# Altium footprint library PcbLib_Pin_Headers_part2.PcbLib: 68 footprints (part 4 of 5)
Each footprint in its own frame and in the unit in brackets; x right, y up, seen from the top. Pads: shape width x height; smd on the part's side, far side on the other; paste and mask are expansions set on the pad; w line width, h text height; cw(c..) or ccw(c..) is an arc to the next point about the centre after c.
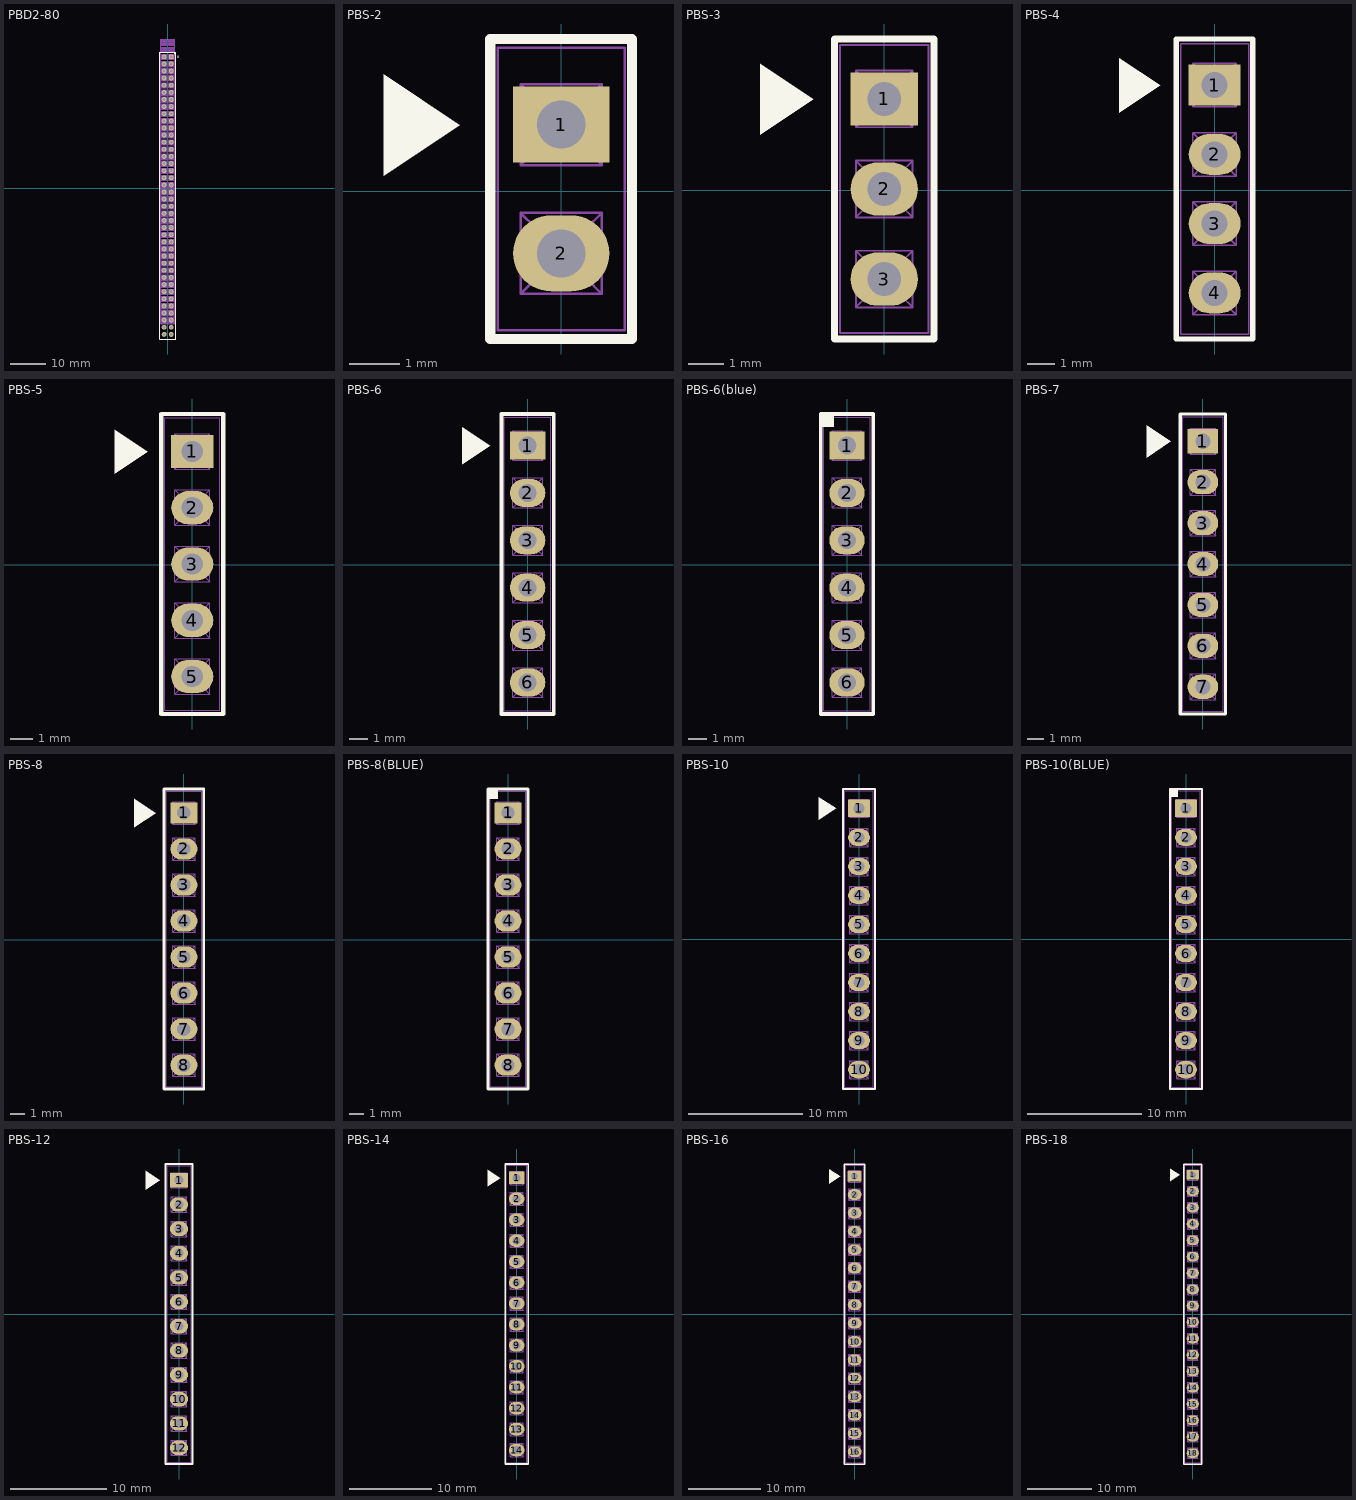
[diagram p3: the footprints below, top view; thin cyan lines are the x and y axes]

## PBD2-80 [mm]
pads (80):
  rect 1.36x1.36 hole 0.8: 1(1,37)
  round 1.36 hole 0.8: 2(-1,37) 3(1,35) 4(-1,35) 5(1,33) 6(-1,33) 7(1,31) 8(-1,31) 9(1,29) 10(-1,29) 11(1,27) 12(-1,27) 13(1,25) 14(-1,25) 15(1,23) 16(-1,23) 17(1,21) 18(-1,21) 19(1,19) 20(-1,19) 21(1,17) 22(-1,17) 23(1,15) 24(-1,15) 25(1,13) 26(-1,13) 27(1,11) 28(-1,11) 29(1,9) 30(-1,9) 31(1,7) 32(-1,7) 33(1,5) 34(-1,5) 35(1,3) 36(-1,3) 37(1,1) 38(-1,1) 39(1,-1) 40(-1,-1) 41(1,-3) 42(-1,-3) 43(1,-5) 44(-1,-5) 45(1,-7) 46(-1,-7) 47(1,-9) 48(-1,-9) 49(1,-11) 50(-1,-11) 51(1,-13) 52(-1,-13) 53(1,-15) 54(-1,-15) 55(1,-17) 56(-1,-17) 57(1,-19) 58(-1,-19) 59(1,-21) 60(-1,-21) 61(1,-23) 62(-1,-23) 63(1,-25) 64(-1,-25) 65(1,-27) 66(-1,-27) 67(1,-29) 68(-1,-29) 69(1,-31) 70(-1,-31) 71(1,-33) 72(-1,-33) 73(1,-35) 74(-1,-35) 75(1,-37) 76(-1,-37) 77(1,-39) 78(-1,-39) 79(1,-41) 80(-1,-41)
Top Overlay:
  circle w0.25: c2.9,37 r0.125
  region: 2.3,37.5 1.5,38.3 2.3,38.3
  lines w0.2: -2.3,-42.3 -2.3,38.3 2.3,38.3 2.3,-42.3 -2.3,-42.3
Top Assy:
  drawing of 2244 lines, arcs and shapes, not listed
  text ".Designator" at 4.17,-3.098 h1.8
3D body "PBD2-80.STEP": height 4.36, standoff -2.64, extent -2,-38 2,42

## PBS-2 [mm] "H = 8.5mm"
pads (2):
  rect 1.9x1.5 hole 0.95: 1(0,1.31)
  oval 1.9x1.5 hole 0.95: 2(0,-1.23)
Top Overlay:
  region: -2,1.3 -3.5,0.3 -3.5,2.3
  lines w0.2: -1.4,-2.92 -1.4,3 1.4,3 1.4,-2.92 -1.4,-2.92
Top Assy:
  lines w0.05: -0.2,-1.73 -0.2,-1.626 ; -0.2,-0.73 -0.2,-0.834 ; -0.2,0.81 -0.2,0.914 ; -0.2,1.81 -0.2,1.706 ; 0.2,-1.73 0.2,-1.626 ; 0.2,-0.73 0.2,-0.834 ; 0.2,0.81 0.2,0.914 ; 0.2,1.81 0.2,1.706 ; -0.8,-2.03 -0.5,-1.73 ; -0.8,-2.03 0.8,-2.03 ; -0.8,-2.03 -0.8,-0.43 ; -0.8,-0.43 -0.5,-0.73 ; -0.8,-0.43 0.8,-0.43 ; -0.8,0.51 -0.5,0.81 ; -0.8,0.51 0.8,0.51 ; -0.8,0.51 -0.8,2.11 ; -0.8,2.11 -0.5,1.81 ; -0.8,2.11 0.8,2.11 ; -0.5,-1.73 -0.5,-0.73 ; -0.5,-1.73 0.5,-1.73 ; -0.5,-0.73 0.5,-0.73 ; -0.5,0.81 -0.5,1.81 ; -0.5,0.81 0.5,0.81 ; -0.5,1.81 0.5,1.81 ; -0.2,-1.626 -0.2,-1.43 ; -0.2,-1.626 0.2,-1.626 ; -0.2,-1.43 -0.2,-1.03 ; -0.2,-1.43 0.2,-1.43 ; -0.2,-1.03 -0.2,-0.834 ; -0.2,-1.03 0.2,-1.03 ; -0.2,-0.834 0.2,-0.834 ; -0.2,0.914 -0.2,1.11 ; -0.2,0.914 0.2,0.914 ; -0.2,1.11 -0.2,1.51 ; -0.2,1.11 0.2,1.11 ; -0.2,1.51 -0.2,1.706 ; -0.2,1.51 0.2,1.51 ; -0.2,1.706 0.2,1.706 ; 0.2,-1.626 0.2,-1.43 ; 0.2,-1.43 0.2,-1.03 ; 0.2,-1.03 0.2,-0.834 ; 0.2,0.914 0.2,1.11 ; 0.2,1.11 0.2,1.51 ; 0.2,1.51 0.2,1.706 ; 0.5,-1.73 0.5,-0.73 ; 0.5,-1.73 0.8,-2.03 ; 0.5,-0.73 0.8,-0.43 ; 0.5,0.81 0.5,1.81 ; 0.5,0.81 0.8,0.51 ; 0.5,1.81 0.8,2.11 ; 0.8,-2.03 0.8,-0.43 ; 0.8,0.51 0.8,2.11 ; -1.25,-2.75 -1.25,2.83 1.25,2.83 1.25,-2.75 -1.25,-2.75
  text ".Designator" at 2.467,-3.443 h2
3D body "User Library-PBS_(DS1023)_1line_connectors_h=5_0_8_5mm_step_2_54mm.step": height 8.5, standoff -3, extent -1.25,-2.75 1.25,2.83

## PBS-3 [mm] "H = 8.5mm"
pads (3):
  rect 1.9x1.5 hole 0.95: 1(0,2.58)
  oval 1.9x1.5 hole 0.95: 2(0,0.04) 3(0,-2.5)
Top Overlay:
  region: -2,2.57 -3.5,1.57 -3.5,3.57
  lines w0.2: -1.4,-4.19 -1.4,4.27 1.4,4.27 1.4,-4.19 -1.4,-4.19
Top Assy:
  lines w0.05: -0.2,-3 -0.2,-2.896 ; -0.2,-2 -0.2,-2.104 ; -0.2,-0.46 -0.2,-0.356 ; -0.2,0.54 -0.2,0.436 ; -0.2,2.08 -0.2,2.184 ; -0.2,3.08 -0.2,2.976 ; 0.2,-3 0.2,-2.896 ; 0.2,-2 0.2,-2.104 ; 0.2,-0.46 0.2,-0.356 ; 0.2,0.54 0.2,0.436 ; 0.2,2.08 0.2,2.184 ; 0.2,3.08 0.2,2.976 ; -0.8,-3.3 -0.5,-3 ; -0.8,-3.3 0.8,-3.3 ; -0.8,-3.3 -0.8,-1.7 ; -0.8,-1.7 -0.5,-2 ; -0.8,-1.7 0.8,-1.7 ; -0.8,-0.76 -0.5,-0.46 ; -0.8,-0.76 0.8,-0.76 ; -0.8,-0.76 -0.8,0.84 ; -0.8,0.84 -0.5,0.54 ; -0.8,0.84 0.8,0.84 ; -0.8,1.78 -0.5,2.08 ; -0.8,1.78 0.8,1.78 ; -0.8,1.78 -0.8,3.38 ; -0.8,3.38 -0.5,3.08 ; -0.8,3.38 0.8,3.38 ; -0.5,-3 -0.5,-2 ; -0.5,-3 0.5,-3 ; -0.5,-2 0.5,-2 ; -0.5,-0.46 -0.5,0.54 ; -0.5,-0.46 0.5,-0.46 ; -0.5,0.54 0.5,0.54 ; -0.5,2.08 -0.5,3.08 ; -0.5,2.08 0.5,2.08 ; -0.5,3.08 0.5,3.08 ; -0.2,-2.896 -0.2,-2.7 ; -0.2,-2.896 0.2,-2.896 ; -0.2,-2.7 -0.2,-2.3 ; -0.2,-2.7 0.2,-2.7 ; -0.2,-2.3 -0.2,-2.104 ; -0.2,-2.3 0.2,-2.3 ; -0.2,-2.104 0.2,-2.104 ; -0.2,-0.356 -0.2,-0.16 ; -0.2,-0.356 0.2,-0.356 ; -0.2,-0.16 -0.2,0.24 ; -0.2,-0.16 0.2,-0.16 ; -0.2,0.24 -0.2,0.436 ; -0.2,0.24 0.2,0.24 ; -0.2,0.436 0.2,0.436 ; -0.2,2.184 -0.2,2.38 ; -0.2,2.184 0.2,2.184 ; -0.2,2.38 -0.2,2.78 ; -0.2,2.38 0.2,2.38 ; -0.2,2.78 -0.2,2.976 ; -0.2,2.78 0.2,2.78 ; -0.2,2.976 0.2,2.976 ; 0.2,-2.896 0.2,-2.7 ; 0.2,-2.7 0.2,-2.3 ; 0.2,-2.3 0.2,-2.104 ; 0.2,-0.356 0.2,-0.16 ; 0.2,-0.16 0.2,0.24 ; 0.2,0.24 0.2,0.436 ; 0.2,2.184 0.2,2.38 ; 0.2,2.38 0.2,2.78 ; 0.2,2.78 0.2,2.976 ; 0.5,-3 0.5,-2 ; 0.5,-3 0.8,-3.3 ; 0.5,-2 0.8,-1.7 ; 0.5,-0.46 0.5,0.54 ; 0.5,-0.46 0.8,-0.76 ; 0.5,0.54 0.8,0.84 ; 0.5,2.08 0.5,3.08 ; 0.5,2.08 0.8,1.78 ; 0.5,3.08 0.8,3.38 ; 0.8,-3.3 0.8,-1.7 ; 0.8,-0.76 0.8,0.84 ; 0.8,1.78 0.8,3.38 ; -1.25,-4.02 -1.25,4.1 1.25,4.1 1.25,-4.02 -1.25,-4.02
  text ".Designator" at 2.467,-3.443 h2
3D body "User Library-PBS_(DS1023)_1line_connectors_h=5_0_8_5mm_step_2_54mm (2).step": height 8.5, standoff -3, extent -1.25,-4.02 1.25,4.1

## PBS-4 [mm] "H = 8.5mm"
pads (4):
  rect 1.9x1.5 hole 0.95: 1(0,3.85)
  oval 1.9x1.5 hole 0.95: 2(0,1.31) 3(0,-1.23) 4(0,-3.77)
Top Overlay:
  region: -2,3.84 -3.5,2.84 -3.5,4.84
  lines w0.2: -1.4,-5.46 1.4,-5.46 1.4,5.54 -1.4,5.54 -1.4,-5.46
Top Assy:
  lines w0.05: -0.2,-4.27 -0.2,-4.166 ; -0.2,-3.27 -0.2,-3.374 ; -0.2,-1.73 -0.2,-1.626 ; -0.2,-0.73 -0.2,-0.834 ; -0.2,0.81 -0.2,0.914 ; -0.2,1.81 -0.2,1.706 ; -0.2,3.35 -0.2,3.454 ; -0.2,4.35 -0.2,4.246 ; 0.2,-4.27 0.2,-4.166 ; 0.2,-3.27 0.2,-3.374 ; 0.2,-1.73 0.2,-1.626 ; 0.2,-0.73 0.2,-0.834 ; 0.2,0.81 0.2,0.914 ; 0.2,1.81 0.2,1.706 ; 0.2,3.35 0.2,3.454 ; 0.2,4.35 0.2,4.246 ; -0.8,-4.57 -0.8,-2.97 ; -0.8,-4.57 0.8,-4.57 ; -0.8,-4.57 -0.5,-4.27 ; -0.8,-2.97 0.8,-2.97 ; -0.8,-2.97 -0.5,-3.27 ; -0.8,-2.03 -0.8,-0.43 ; -0.8,-2.03 0.8,-2.03 ; -0.8,-2.03 -0.5,-1.73 ; -0.8,-0.43 0.8,-0.43 ; -0.8,-0.43 -0.5,-0.73 ; -0.8,0.51 -0.8,2.11 ; -0.8,0.51 0.8,0.51 ; -0.8,0.51 -0.5,0.81 ; -0.8,2.11 0.8,2.11 ; -0.8,2.11 -0.5,1.81 ; -0.8,3.05 -0.8,4.65 ; -0.8,3.05 0.8,3.05 ; -0.8,3.05 -0.5,3.35 ; -0.8,4.65 0.8,4.65 ; -0.8,4.65 -0.5,4.35 ; -0.5,-4.27 0.5,-4.27 ; -0.5,-4.27 -0.5,-3.27 ; -0.5,-3.27 0.5,-3.27 ; -0.5,-1.73 0.5,-1.73 ; -0.5,-1.73 -0.5,-0.73 ; -0.5,-0.73 0.5,-0.73 ; -0.5,0.81 0.5,0.81 ; -0.5,0.81 -0.5,1.81 ; -0.5,1.81 0.5,1.81 ; -0.5,3.35 0.5,3.35 ; -0.5,3.35 -0.5,4.35 ; -0.5,4.35 0.5,4.35 ; -0.2,-4.166 0.2,-4.166 ; -0.2,-4.166 -0.2,-3.97 ; -0.2,-3.97 0.2,-3.97 ; -0.2,-3.97 -0.2,-3.57 ; -0.2,-3.57 0.2,-3.57 ; -0.2,-3.57 -0.2,-3.374 ; -0.2,-3.374 0.2,-3.374 ; -0.2,-1.626 0.2,-1.626 ; -0.2,-1.626 -0.2,-1.43 ; -0.2,-1.43 0.2,-1.43 ; -0.2,-1.43 -0.2,-1.03 ; -0.2,-1.03 0.2,-1.03 ; -0.2,-1.03 -0.2,-0.834 ; -0.2,-0.834 0.2,-0.834 ; -0.2,0.914 0.2,0.914 ; -0.2,0.914 -0.2,1.11 ; -0.2,1.11 0.2,1.11 ; -0.2,1.11 -0.2,1.51 ; -0.2,1.51 0.2,1.51 ; -0.2,1.51 -0.2,1.706 ; -0.2,1.706 0.2,1.706 ; -0.2,3.454 0.2,3.454 ; -0.2,3.454 -0.2,3.65 ; -0.2,3.65 0.2,3.65 ; -0.2,3.65 -0.2,4.05 ; -0.2,4.05 0.2,4.05 ; -0.2,4.05 -0.2,4.246 ; -0.2,4.246 0.2,4.246 ; 0.2,-4.166 0.2,-3.97 ; 0.2,-3.97 0.2,-3.57 ; 0.2,-3.57 0.2,-3.374 ; 0.2,-1.626 0.2,-1.43 ; 0.2,-1.43 0.2,-1.03 ; 0.2,-1.03 0.2,-0.834 ; 0.2,0.914 0.2,1.11 ; 0.2,1.11 0.2,1.51 ; 0.2,1.51 0.2,1.706 ; 0.2,3.454 0.2,3.65 ; 0.2,3.65 0.2,4.05 ; 0.2,4.05 0.2,4.246 ; 0.5,-4.27 0.8,-4.57 ; 0.5,-4.27 0.5,-3.27 ; 0.5,-3.27 0.8,-2.97 ; 0.5,-1.73 0.8,-2.03 ; 0.5,-1.73 0.5,-0.73 ; 0.5,-0.73 0.8,-0.43 ; 0.5,0.81 0.8,0.51 ; 0.5,0.81 0.5,1.81 ; 0.5,1.81 0.8,2.11 ; 0.5,3.35 0.8,3.05 ; 0.5,3.35 0.5,4.35 ; 0.5,4.35 0.8,4.65 ; 0.8,-4.57 0.8,-2.97 ; 0.8,-2.03 0.8,-0.43 ; 0.8,0.51 0.8,2.11 ; 0.8,3.05 0.8,4.65 ; -1.25,-5.29 1.25,-5.29 1.25,5.37 -1.25,5.37 -1.25,-5.29
  text ".Designator" at 2.467,-3.443 h2
3D body "User Library-PBS_(DS1023)_1line_connectors_h=5_0_8_5mm_step_2_54mm (1).step": height 8.5, standoff -3, extent -1.25,-5.29 1.25,5.37

## PBS-5 [mm] "H = 8.5mm"
pads (5):
  rect 1.9x1.5 hole 0.95: 1(0,5.12)
  oval 1.9x1.5 hole 0.95: 2(0,2.58) 3(0,0.04) 4(0,-2.5) 5(0,-5.04)
Top Overlay:
  region: -2,5.11 -3.5,4.11 -3.5,6.11
  lines w0.2: -1.4,-6.73 1.4,-6.73 1.4,6.81 -1.4,6.81 -1.4,-6.73
Top Assy:
  lines w0.05: -0.2,-5.54 -0.2,-5.436 ; -0.2,-4.54 -0.2,-4.644 ; -0.2,-3 -0.2,-2.896 ; -0.2,-2 -0.2,-2.104 ; -0.2,-0.46 -0.2,-0.356 ; -0.2,0.54 -0.2,0.436 ; -0.2,2.08 -0.2,2.184 ; -0.2,3.08 -0.2,2.976 ; -0.2,4.62 -0.2,4.724 ; -0.2,5.62 -0.2,5.516 ; 0.2,-5.54 0.2,-5.436 ; 0.2,-4.54 0.2,-4.644 ; 0.2,-3 0.2,-2.896 ; 0.2,-2 0.2,-2.104 ; 0.2,-0.46 0.2,-0.356 ; 0.2,0.54 0.2,0.436 ; 0.2,2.08 0.2,2.184 ; 0.2,3.08 0.2,2.976 ; 0.2,4.62 0.2,4.724 ; 0.2,5.62 0.2,5.516 ; -0.8,-5.84 -0.8,-4.24 ; -0.8,-5.84 0.8,-5.84 ; -0.8,-5.84 -0.5,-5.54 ; -0.8,-4.24 0.8,-4.24 ; -0.8,-4.24 -0.5,-4.54 ; -0.8,-3.3 -0.8,-1.7 ; -0.8,-3.3 0.8,-3.3 ; -0.8,-3.3 -0.5,-3 ; -0.8,-1.7 0.8,-1.7 ; -0.8,-1.7 -0.5,-2 ; -0.8,-0.76 -0.8,0.84 ; -0.8,-0.76 0.8,-0.76 ; -0.8,-0.76 -0.5,-0.46 ; -0.8,0.84 0.8,0.84 ; -0.8,0.84 -0.5,0.54 ; -0.8,1.78 -0.8,3.38 ; -0.8,1.78 0.8,1.78 ; -0.8,1.78 -0.5,2.08 ; -0.8,3.38 0.8,3.38 ; -0.8,3.38 -0.5,3.08 ; -0.8,4.32 -0.8,5.92 ; -0.8,4.32 0.8,4.32 ; -0.8,4.32 -0.5,4.62 ; -0.8,5.92 0.8,5.92 ; -0.8,5.92 -0.5,5.62 ; -0.5,-5.54 0.5,-5.54 ; -0.5,-5.54 -0.5,-4.54 ; -0.5,-4.54 0.5,-4.54 ; -0.5,-3 0.5,-3 ; -0.5,-3 -0.5,-2 ; -0.5,-2 0.5,-2 ; -0.5,-0.46 0.5,-0.46 ; -0.5,-0.46 -0.5,0.54 ; -0.5,0.54 0.5,0.54 ; -0.5,2.08 0.5,2.08 ; -0.5,2.08 -0.5,3.08 ; -0.5,3.08 0.5,3.08 ; -0.5,4.62 0.5,4.62 ; -0.5,4.62 -0.5,5.62 ; -0.5,5.62 0.5,5.62 ; -0.2,-5.436 0.2,-5.436 ; -0.2,-5.436 -0.2,-5.24 ; -0.2,-5.24 0.2,-5.24 ; -0.2,-5.24 -0.2,-4.84 ; -0.2,-4.84 0.2,-4.84 ; -0.2,-4.84 -0.2,-4.644 ; -0.2,-4.644 0.2,-4.644 ; -0.2,-2.896 0.2,-2.896 ; -0.2,-2.896 -0.2,-2.7 ; -0.2,-2.7 0.2,-2.7 ; -0.2,-2.7 -0.2,-2.3 ; -0.2,-2.3 0.2,-2.3 ; -0.2,-2.3 -0.2,-2.104 ; -0.2,-2.104 0.2,-2.104 ; -0.2,-0.356 0.2,-0.356 ; -0.2,-0.356 -0.2,-0.16 ; -0.2,-0.16 0.2,-0.16 ; -0.2,-0.16 -0.2,0.24 ; -0.2,0.24 0.2,0.24 ; -0.2,0.24 -0.2,0.436 ; -0.2,0.436 0.2,0.436 ; -0.2,2.184 0.2,2.184 ; -0.2,2.184 -0.2,2.38 ; -0.2,2.38 0.2,2.38 ; -0.2,2.38 -0.2,2.78 ; -0.2,2.78 0.2,2.78 ; -0.2,2.78 -0.2,2.976 ; -0.2,2.976 0.2,2.976 ; -0.2,4.724 0.2,4.724 ; -0.2,4.724 -0.2,4.92 ; -0.2,4.92 0.2,4.92 ; -0.2,4.92 -0.2,5.32 ; -0.2,5.32 0.2,5.32 ; -0.2,5.32 -0.2,5.516 ; -0.2,5.516 0.2,5.516 ; 0.2,-5.436 0.2,-5.24 ; 0.2,-5.24 0.2,-4.84 ; 0.2,-4.84 0.2,-4.644 ; 0.2,-2.896 0.2,-2.7 ; 0.2,-2.7 0.2,-2.3 ; 0.2,-2.3 0.2,-2.104 ; 0.2,-0.356 0.2,-0.16 ; 0.2,-0.16 0.2,0.24 ; 0.2,0.24 0.2,0.436 ; 0.2,2.184 0.2,2.38 ; 0.2,2.38 0.2,2.78 ; 0.2,2.78 0.2,2.976 ; 0.2,4.724 0.2,4.92 ; 0.2,4.92 0.2,5.32 ; 0.2,5.32 0.2,5.516 ; 0.5,-5.54 0.8,-5.84 ; 0.5,-5.54 0.5,-4.54 ; 0.5,-4.54 0.8,-4.24 ; 0.5,-3 0.8,-3.3 ; 0.5,-3 0.5,-2 ; 0.5,-2 0.8,-1.7 ; 0.5,-0.46 0.8,-0.76 ; 0.5,-0.46 0.5,0.54 ; 0.5,0.54 0.8,0.84 ; 0.5,2.08 0.8,1.78 ; 0.5,2.08 0.5,3.08 ; 0.5,3.08 0.8,3.38 ; 0.5,4.62 0.8,4.32 ; 0.5,4.62 0.5,5.62 ; 0.5,5.62 0.8,5.92 ; 0.8,-5.84 0.8,-4.24 ; 0.8,-3.3 0.8,-1.7 ; 0.8,-0.76 0.8,0.84 ; 0.8,1.78 0.8,3.38 ; 0.8,4.32 0.8,5.92 ; -1.25,-6.56 1.25,-6.56 1.25,6.64 -1.25,6.64 -1.25,-6.56
  text ".Designator" at 2.467,-3.443 h2
3D body "User Library-PBS_(DS1023)_1line_connectors_h=5_0_8_5mm_step_2_54mm (2).step": height 8.5, standoff -3, extent -1.25,-6.56 1.25,6.64

## PBS-6 [mm] "H = 8.5mm"
pads (6):
  rect 1.9x1.5 hole 0.95: 1(0,6.39)
  oval 1.9x1.5 hole 0.95: 2(0,3.85) 3(0,1.31) 4(0,-1.23) 5(0,-3.77) 6(0,-6.31)
Top Overlay:
  region: -2,6.38 -3.5,5.38 -3.5,7.38
  lines w0.2: -1.4,-8 -1.4,8.08 1.4,8.08 1.4,-8 -1.4,-8
Top Assy:
  drawing of 160 lines, arcs and shapes, not listed
  text ".Designator" at 2.467,-3.443 h2
3D body "User Library-PBS_(DS1023)_1line_connectors_h=5_0_8_5mm_step_2_54mm (1).step": height 8.5, standoff -3, extent -1.25,-7.83 1.25,7.91

## PBS-6(blue) [mm] "H = 8.5mm"
pads (6):
  rect 1.9x1.5 hole 0.95: 1(0,6.39)
  oval 1.9x1.5 hole 0.95: 2(0,3.85) 3(0,1.31) 4(0,-1.23) 5(0,-3.77) 6(0,-6.31)
Top Overlay:
  region: -0.7,8.08 -1.4,8.08 -1.4,7.38 -0.7,7.38
  lines w0.2: -1.4,-8 1.4,-8 1.4,8.08 -1.4,8.08 -1.4,-8
Top Assy:
  drawing of 160 lines, arcs and shapes, not listed
  text ".Designator" at 2.467,-3.443 h2
3D body "PBS-6.step": height 8.5, standoff -3, extent -1.25,-7.83 1.25,7.91

## PBS-7 [mm] "H = 8.5mm"
pads (7):
  rect 1.9x1.5 hole 0.95: 1(0,7.66)
  oval 1.9x1.5 hole 0.95: 2(0,5.12) 3(0,2.58) 4(0,0.04) 5(0,-2.5) 6(0,-5.04) 7(0,-7.58)
Top Overlay:
  region: -2,7.65 -3.5,6.65 -3.5,8.65
  lines w0.2: -1.4,-9.27 1.4,-9.27 1.4,9.35 -1.4,9.35 -1.4,-9.27
Top Assy:
  drawing of 186 lines, arcs and shapes, not listed
  text ".Designator" at 2.467,-3.443 h2
3D body "User Library-PBS_(DS1023)_1line_connectors_h=5_0_8_5mm_step_2_54mm (2).step": height 8.5, standoff -3, extent -1.25,-9.1 1.25,9.18

## PBS-8 [mm] "H = 8.5mm"
pads (8):
  rect 1.9x1.5 hole 0.95: 1(0,8.93)
  oval 1.9x1.5 hole 0.95: 2(0,6.39) 3(0,3.85) 4(0,1.31) 5(0,-1.23) 6(0,-3.77) 7(0,-6.31) 8(0,-8.85)
Top Overlay:
  region: -2,8.92 -3.5,7.92 -3.5,9.92
  lines w0.2: -1.4,-10.54 -1.4,10.62 1.4,10.62 1.4,-10.54 -1.4,-10.54
Top Assy:
  drawing of 212 lines, arcs and shapes, not listed
  text ".Designator" at 2.467,-3.443 h2
3D body "User Library-PBS_(DS1023)_1line_connectors_h=5_0_8_5mm_step_2_54mm (1).step": height 8.5, standoff -3, extent -1.25,-10.37 1.25,10.45

## PBS-8(BLUE) [mm] "H = 8.5mm"
pads (8):
  rect 1.9x1.5 hole 0.95: 1(0,8.93)
  oval 1.9x1.5 hole 0.95: 2(0,6.39) 3(0,3.85) 4(0,1.31) 5(0,-1.23) 6(0,-3.77) 7(0,-6.31) 8(0,-8.85)
Top Overlay:
  region: -0.7,10.62 -1.4,10.62 -1.4,9.92 -0.7,9.92
  lines w0.2: -1.4,-10.54 -1.4,10.62 1.4,10.62 1.4,-10.54 -1.4,-10.54
Top Assy:
  drawing of 212 lines, arcs and shapes, not listed
  text ".Designator" at 2.467,-3.443 h2
3D body "PBS-8.step": height 8.5, standoff -3, extent -1.25,-10.37 1.25,10.45

## PBS-10 [mm] "H = 8.5mm"
pads (10):
  rect 1.9x1.5 hole 0.95: 1(0,11.47)
  oval 1.9x1.5 hole 0.95: 2(0,8.93) 3(0,6.39) 4(0,3.85) 5(0,1.31) 6(0,-1.23) 7(0,-3.77) 8(0,-6.31) 9(0,-8.85) 10(0,-11.39)
Top Overlay:
  region: -2,11.46 -3.5,10.46 -3.5,12.46
  lines w0.2: -1.4,-13.08 -1.4,13.16 1.4,13.16 1.4,-13.08 -1.4,-13.08
Top Assy:
  drawing of 264 lines, arcs and shapes, not listed
  text ".Designator" at 2.467,-3.443 h2
3D body "User Library-PBS_(DS1023)_1line_connectors_h=5_0_8_5mm_step_2_54mm (2).step": height 8.5, standoff -3, extent -1.25,-12.91 1.25,12.99

## PBS-10(BLUE) [mm] "H = 8.5mm"
pads (10):
  rect 1.9x1.5 hole 0.95: 1(0,11.47)
  oval 1.9x1.5 hole 0.95: 2(0,8.93) 3(0,6.39) 4(0,3.85) 5(0,1.31) 6(0,-1.23) 7(0,-3.77) 8(0,-6.31) 9(0,-8.85) 10(0,-11.39)
Top Overlay:
  region: -0.7,13.16 -1.4,13.16 -1.4,12.46 -0.7,12.46
  lines w0.2: -1.4,-13.08 -1.4,13.16 1.4,13.16 1.4,-13.08 -1.4,-13.08
Top Assy:
  drawing of 264 lines, arcs and shapes, not listed
  text ".Designator" at 2.467,-3.443 h2
3D body "PBS-10.step": height 8.5, standoff -3, extent -1.25,-12.91 1.25,12.99

## PBS-12 [mm] "H = 8.5mm"
pads (12):
  rect 1.9x1.5 hole 0.95: 1(0,14.01)
  oval 1.9x1.5 hole 0.95: 2(0,11.47) 3(0,8.93) 4(0,6.39) 5(0,3.85) 6(0,1.31) 7(0,-1.23) 8(0,-3.77) 9(0,-6.31) 10(0,-8.85) 11(0,-11.39) 12(0,-13.93)
Top Overlay:
  region: -2,14 -3.5,13 -3.5,15
  lines w0.2: -1.4,-15.62 1.4,-15.62 1.4,15.7 -1.4,15.7 -1.4,-15.62
Top Assy:
  drawing of 316 lines, arcs and shapes, not listed
  text ".Designator" at 2.467,-5.983 h2
3D body "User Library-PBS_(DS1023)_1line_connectors_h=5_0_8_5mm_step_2_54mm (1).step": height 8.5, standoff -3, extent -1.25,-15.45 1.25,15.53

## PBS-14 [mm] "H = 8.5mm"
pads (14):
  rect 1.9x1.5 hole 0.95: 1(0,16.55)
  oval 1.9x1.5 hole 0.95: 2(0,14.01) 3(0,11.47) 4(0,8.93) 5(0,6.39) 6(0,3.85) 7(0,1.31) 8(0,-1.23) 9(0,-3.77) 10(0,-6.31) 11(0,-8.85) 12(0,-11.39) 13(0,-13.93) 14(0,-16.47)
Top Overlay:
  region: -2,16.54 -3.5,15.54 -3.5,17.54
  lines w0.2: -1.4,-18.16 1.4,-18.16 1.4,18.24 -1.4,18.24 -1.4,-18.16
Top Assy:
  drawing of 368 lines, arcs and shapes, not listed
  text ".Designator" at 2.467,-3.443 h2
3D body "User Library-PBS_(DS1023)_1line_connectors_h=5_0_8_5mm_step_2_54mm (2).step": height 8.5, standoff -3, extent -1.25,-17.99 1.25,18.07

## PBS-16 [mm] "H = 8.5mm"
pads (16):
  rect 1.9x1.5 hole 0.95: 1(0,19.09)
  oval 1.9x1.5 hole 0.95: 2(0,16.55) 3(0,14.01) 4(0,11.47) 5(0,8.93) 6(0,6.39) 7(0,3.85) 8(0,1.31) 9(0,-1.23) 10(0,-3.77) 11(0,-6.31) 12(0,-8.85) 13(0,-11.39) 14(0,-13.93) 15(0,-16.47) 16(0,-19.01)
Top Overlay:
  region: -2,19.08 -3.5,18.08 -3.5,20.08
  lines w0.2: -1.4,-20.7 1.4,-20.7 1.4,20.78 -1.4,20.78 -1.4,-20.7
Top Assy:
  drawing of 420 lines, arcs and shapes, not listed
  text ".Designator" at 2.467,-3.443 h2
3D body "User Library-PBS_(DS1023)_1line_connectors_h=5_0_8_5mm_step_2_54mm (1).step": height 8.5, standoff -3, extent -1.25,-20.53 1.25,20.61

## PBS-18 [mm] "H = 8.5mm"
pads (18):
  rect 1.9x1.5 hole 0.95: 1(0,21.63)
  oval 1.9x1.5 hole 0.95: 2(0,19.09) 3(0,16.55) 4(0,14.01) 5(0,11.47) 6(0,8.93) 7(0,6.39) 8(0,3.85) 9(0,1.31) 10(0,-1.23) 11(0,-3.77) 12(0,-6.31) 13(0,-8.85) 14(0,-11.39) 15(0,-13.93) 16(0,-16.47) 17(0,-19.01) 18(0,-21.55)
Top Overlay:
  region: -2,21.62 -3.5,20.62 -3.5,22.62
  lines w0.2: -1.4,-23.24 1.4,-23.24 1.4,23.32 -1.4,23.32 -1.4,-23.24
Top Assy:
  drawing of 472 lines, arcs and shapes, not listed
  text ".Designator" at 2.467,-3.443 h2
3D body "User Library-PBS_(DS1023)_1line_connectors_h=5_0_8_5mm_step_2_54mm (2).step": height 8.5, standoff -3, extent -1.25,-23.07 1.25,23.15